# Altium footprint library JL_PCB.PCBLIB: 1129 footprints (part 60 of 72)
Each footprint in its own frame and in the unit in brackets; x right, y up, seen from the top. Pads: shape width x height; smd on the part's side, far side on the other; paste and mask are expansions set on the pad; w line width, h text height; cw(c..) or ccw(c..) is an arc to the next point about the centre after c.
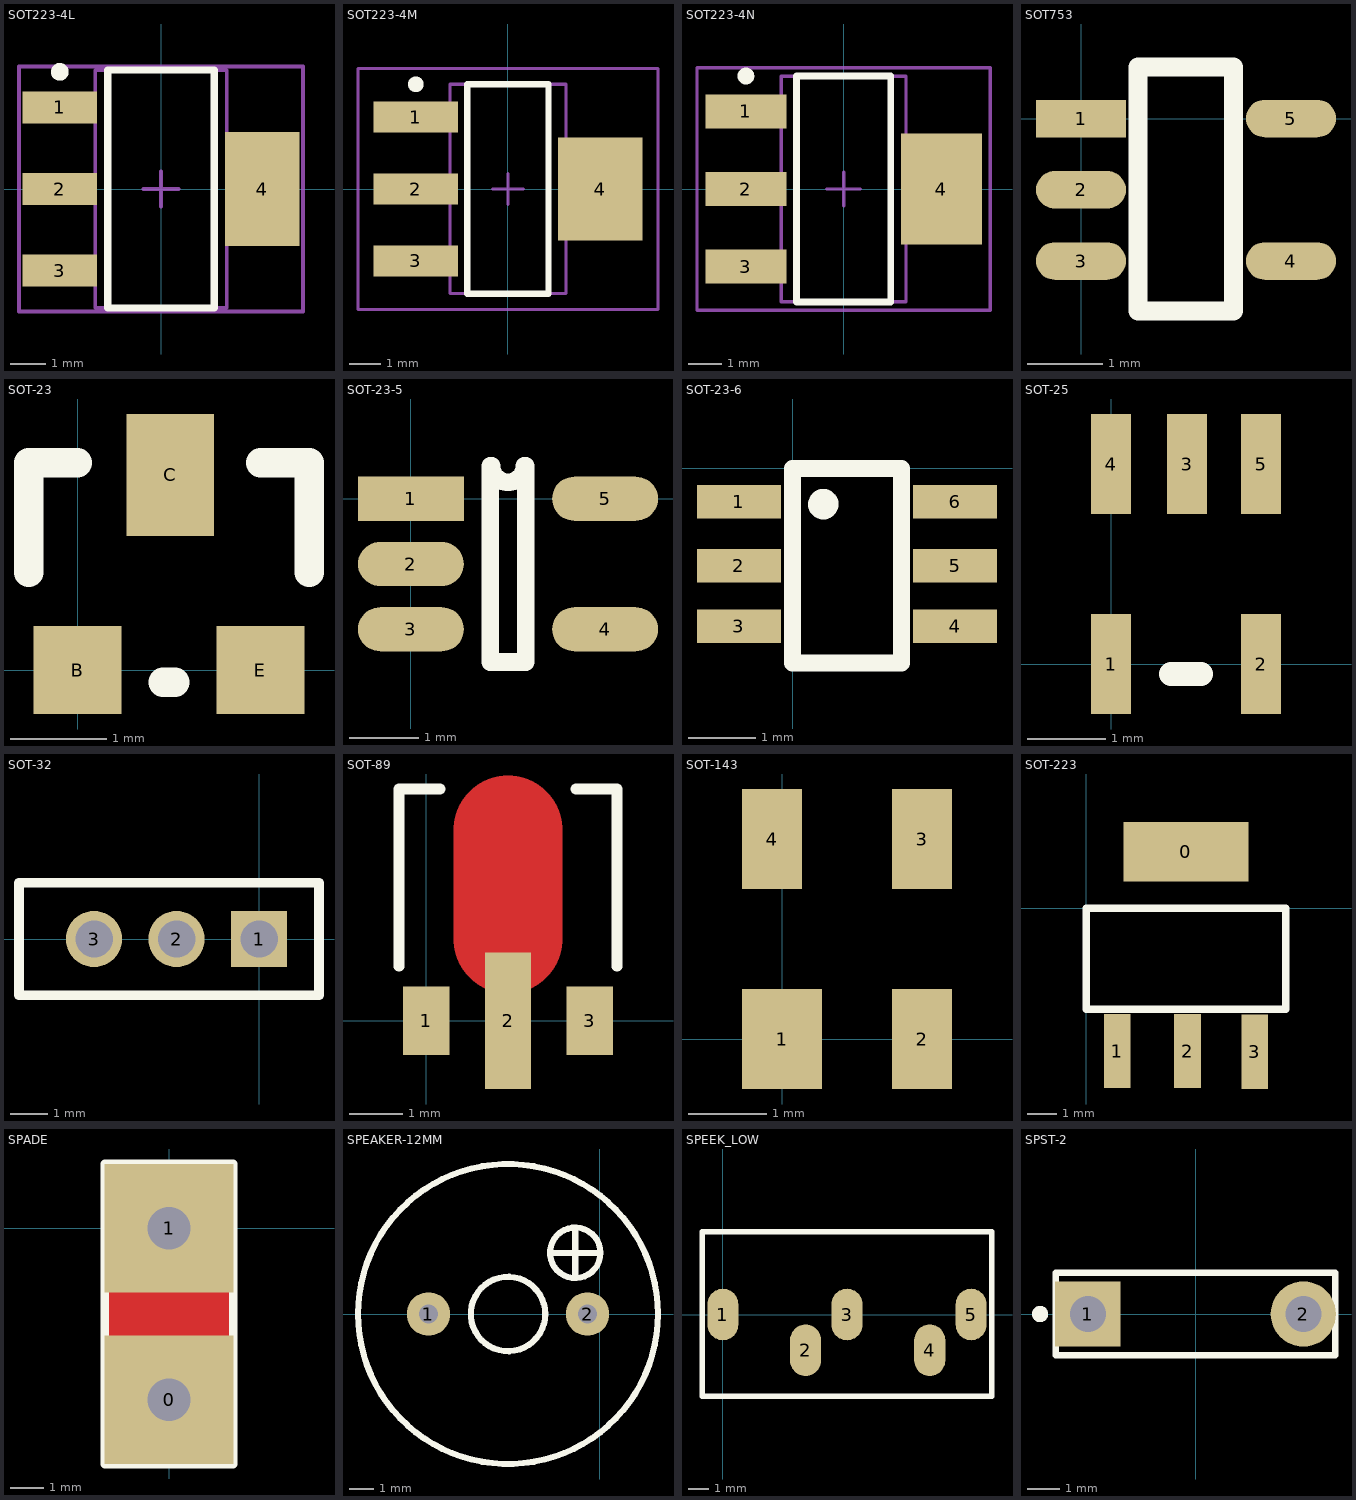
[diagram p59: the footprints below, top view; thin cyan lines are the x and y axes]

## SOT223-4L [mm] "SOT223, 4-Leads, Body 6.5x3.5mm, Pitch 2.3mm, Lead Span 7mm, IPC High Density"
height 1.7
pads (4):
  rect 2.1x0.9 smd: 1(-2.85,2.3) 2(-2.85,0) 3(-2.85,-2.3)
  rect 2.1x3.2 smd: 4(2.85,0)
TopOverlay:
  circle w0.25: c-2.85,3.3 r0.125
  lines w0.2: -1.5,-3.35 1.5,-3.35 1.5,3.35 -1.5,3.35 -1.5,-3.35
Mechanical13:
  lines w0.1: -1.85,-3.35 1.85,-3.35 1.85,3.35 -1.85,3.35 -1.85,-3.35
Mechanical15:
  lines w0.1: -0.5,0 0.5,0 ; 0,-0.5 0,0.5 ; -4,-3.45 4,-3.45 4,3.45 -4,3.45 -4,-3.45
3D body: height 1.7, standoff 0, extent -1.85,-3.35 1.85,3.35

## SOT223-4M [mm] "SOT223, 4-Leads, Body 6.5x3.5mm, Pitch 2.3mm, Lead Span 7mm, IPC Low Density"
height 1.7
pads (4):
  rect 2.7x1 smd: 1(-2.95,2.3) 2(-2.95,0) 3(-2.95,-2.3)
  rect 2.7x3.3 smd: 4(2.95,0)
TopOverlay:
  circle w0.25: c-2.95,3.35 r0.125
  lines w0.2: -1.3,-3.35 -1.3,3.35 1.3,3.35 1.3,-3.35 -1.3,-3.35
Mechanical13:
  lines w0.1: -1.85,-3.35 -1.85,3.35 1.85,3.35 1.85,-3.35 -1.85,-3.35
Mechanical15:
  lines w0.1: -0.5,0 0.5,0 ; 0,-0.5 0,0.5 ; -4.8,-3.85 -4.8,3.85 4.8,3.85 4.8,-3.85 -4.8,-3.85
3D body: height 1.7, standoff 0, extent -1.85,-3.35 1.85,3.35

## SOT223-4N [mm] "SOT223, 4-Leads, Body 6.5x3.5mm, Pitch 2.3mm, Lead Span 7mm, IPC Medium Density"
height 1.7
pads (4):
  rect 2.4x1 smd: 1(-2.9,2.3) 2(-2.9,0) 3(-2.9,-2.3)
  rect 2.4x3.3 smd: 4(2.9,0)
TopOverlay:
  circle w0.25: c-2.9,3.35 r0.125
  lines w0.2: -1.4,-3.35 -1.4,3.35 1.4,3.35 1.4,-3.35 -1.4,-3.35
Mechanical13:
  lines w0.1: -1.85,-3.35 -1.85,3.35 1.85,3.35 1.85,-3.35 -1.85,-3.35
Mechanical15:
  lines w0.1: -0.5,0 0.5,0 ; 0,-0.5 0,0.5 ; -4.35,-3.6 -4.35,3.6 4.35,3.6 4.35,-3.6 -4.35,-3.6
3D body: height 1.7, standoff 0, extent -1.85,-3.35 1.85,3.35

## SOT753 [mm]
pads (5):
  rect 1.2x0.5 smd: 1(0,0)
  oval 1.2x0.5 smd: 2(0,-0.95) 3(0,-1.9) 4(2.8,-1.9) 5(2.8,0)
TopOverlay:
  lines w0.254: 0.762,-2.565 0.762,0.686 2.032,0.686 2.032,-2.565 0.762,-2.565

## SOT-23 [mil]
pads (3):
  rect 36x36 smd: B(0,0) E(75,0)
  rect 36x50 smd: C(38,80)
TopOverlay:
  lines w12: -20,40 -20,85 0,85 ; 35,-5 40,-5 ; 75,85 95,85 95,40
3D body "CircuitWorks-SOT-23.step": height 43.91, standoff 0.6, extent -22.05,-4.21 96.06,94.21

## SOT-23-5 [mil]
pads (5):
  rect 60x25 smd: 1(0,0)
  oval 60x25 smd: 2(0,-37) 3(0,-74) 4(110,-74) 5(110,0)
TopOverlay:
  lines w10: 45,18.5 45,-92.5 65,-92.5 65,18.5 ; 45.75,18.5 ccw(c55,18.5) 64.25,18.5
3D body "SOT-23-5.STEP": height 47.24, standoff 0, extent -2.11,-93.09 108.12,21.09

## SOT-23-6 [mm]
height 1.25
pads (6):
  rect 1.25x0.5 smd: 1(-0.8,-0.5) 2(-0.8,-1.45) 3(-0.8,-2.35) 4(2.425,-2.35) 5(2.425,-1.45) 6(2.425,-0.5)
TopOverlay:
  lines w0.254: 0.555,-0.506 ccw(c0.459,-0.533) 0.559,-0.533 ; 0,-2.9 1.625,-2.9 1.625,0 0,0 0,-2.9
3D body "User Library-SOT-23-6.step": height 1.11, standoff 0.02, extent -0.419,-2.845 2.007,-0.051

## SOT-25 [mil]
pads (5):
  rect 20x50 smd: 1(0,0) 2(75,0) 3(38,100) 4(0,100) 5(75,100)
TopOverlay:
  lines w12: 30,-5 45,-5

## SOT-32 [mm]
pads (3):
  rect 1.5x1.5 hole 1: 1(0,0)
  round 1.5 hole 1: 2(-2.2,0) 3(-4.4,0)
TopOverlay:
  lines w0.254: -4.4,1.5 -6.4,1.5 ; -6.4,1.5 1.6,1.5 1.6,-1.5 -6.4,-1.5 -6.4,1.5

## SOT-89 [mil]
pads (3):
  rect 34x50 smd: 1(0,0) 3(120,0)
  rect 34x100 smd: 2(60,0)
TopLayer:
  lines w80: 60,60 60,140
TopOverlay:
  lines w8: -20,40 -20,170 10,170 ; 110,170 140,170 140,40

## SOT-143 [mil]
pads (4):
  rect 40x50 smd: 1(0,0)
  rect 30x50 smd: 2(70,0) 3(70,100) 4(-5,100)

## SOT-223 [mm]
height 1.8
pads (4):
  rect 4.2x2 smd: 0(3.35,1.9)
  rect 0.9x2.5 smd: 1(1.041,-4.801) 2(3.404,-4.801) 3(5.664,-4.826)
TopOverlay:
  lines w0.254: 0,-3.4 6.7,-3.4 6.7,0 0,0 0,-3.4
3D body "SOT-223.STEP": height 1.86, standoff -0.06, extent 0.03,-5.3 6.736,1.904

## SPADE [mil]
pads (2):
  rect 150x150 hole 50: 0(0,-200) 1(0,0)
TopLayer:
  rectangle: -75,-150 75,-50
BottomLayer:
  rectangle: -75,-150 75,-50
TopOverlay:
  lines w10: -75,-275 -75,75 75,75 75,-275 -75,-275

## SPEAKER-12MM [mm]
pads (2):
  round 1.8 hole 0.8: 1(-7.112,0) 2(-0.508,0)
TopOverlay:
  circle w0.254: c-3.81,0 r1.545
  circle w0.254: c-1.016,2.54 r1.047
  circle w0.254: c-3.81,0 r6.227
  lines w0.254: -2.032,2.54 0.031,2.54 ; -1.016,1.524 -1.016,3.556

## SPEEK_LOW [mm]
pads (5):
  oval 1.5x2.5 all layers, no hole: 1(0,0) 2(4,-1.73) 3(6,0) 4(10,-1.73) 5(12,0)
TopOverlay:
  lines w0.254: -1,-3.95 -1,4 13,4 13,-3.95 -1,-3.95
Mechanical1:
  lines w0.254: -0.35,-0.65 ccw(c-0.05,-0.65) -0.05,-0.95 0.05,-0.95 ccw(c0.05,-0.65) 0.35,-0.65 0.35,0.65 ccw(c0.05,0.65) 0.05,0.95 -0.05,0.95 ccw(c-0.05,0.65) -0.35,0.65 -0.35,-0.65 ; 3.65,-2.35 ccw(c3.95,-2.35) 3.95,-2.65 4.05,-2.65 ccw(c4.05,-2.35) 4.35,-2.35 4.35,-1.05 ccw(c4.05,-1.05) 4.05,-0.75 3.95,-0.75 ccw(c3.95,-1.05) 3.65,-1.05 3.65,-2.35 ; 5.65,-0.6 ccw(c5.95,-0.6) 5.95,-0.9 6.05,-0.9 ccw(c6.05,-0.6) 6.35,-0.6 6.35,0.7 ccw(c6.05,0.7) 6.05,1 5.95,1 ccw(c5.95,0.7) 5.65,0.7 5.65,-0.6 ; 9.65,-2.4 ccw(c9.95,-2.4) 9.95,-2.7 10.05,-2.7 ccw(c10.05,-2.4) 10.35,-2.4 10.35,-1.1 ccw(c10.05,-1.1) 10.05,-0.8 9.95,-0.8 ccw(c9.95,-1.1) 9.65,-1.1 9.65,-2.4 ; 11.65,-0.65 ccw(c11.95,-0.65) 11.95,-0.95 12.05,-0.95 ccw(c12.05,-0.65) 12.35,-0.65 12.35,0.65 ccw(c12.05,0.65) 12.05,0.95 11.95,0.95 ccw(c11.95,0.65) 11.65,0.65 11.65,-0.65

## SPST-2 [mm] "Circuit Breaker; 2 Leads"
pads (2):
  rect 2x2 hole 1.1: 1(-3.3,0)
  round 2 hole 1.1: 2(3.3,0)
TopOverlay:
  circle w0.25: c-4.761,-0.001 r0.125
  lines w0.2: -4.28,-1.27 -4.28,1.27 4.28,1.27 4.28,-1.27 -4.28,-1.27